# Altium footprint library Connector_Samtec_HLE_SMD.PcbLib: 290 footprints (part 15 of 24)
Each footprint in its own frame and in the unit in brackets; x right, y up, seen from the top. Pads: shape width x height; smd on the part's side, far side on the other; paste and mask are expansions set on the pad; w line width, h text height; cw(c..) or ccw(c..) is an arc to the next point about the centre after c.
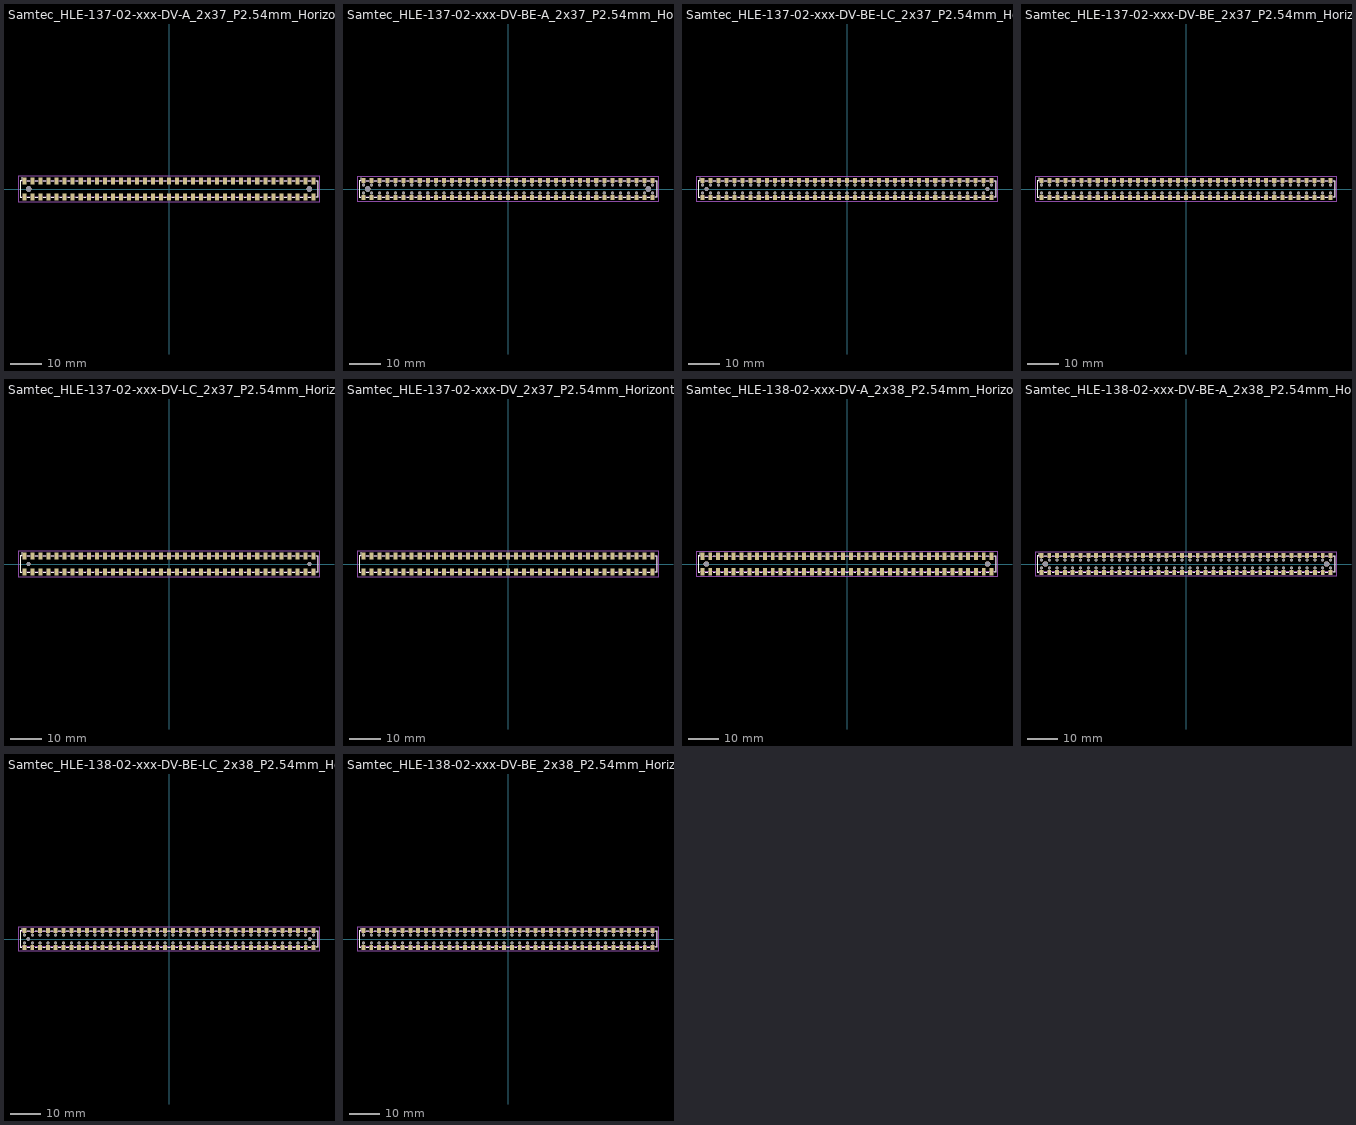
[diagram p14: the footprints below, top view; thin cyan lines are the x and y axes]

## Samtec_HLE-137-02-xxx-DV-A_2x37_P2.54mm_Horizontal [mm]
pads (76):
  rect 1.27x2.29 smd: 1(-45.72,2.525) 2(-45.72,-2.525) 3(-43.18,2.525) 4(-43.18,-2.525) 5(-40.64,2.525) 6(-40.64,-2.525) 7(-38.1,2.525) 8(-38.1,-2.525) 9(-35.56,2.525) 10(-35.56,-2.525) 11(-33.02,2.525) 12(-33.02,-2.525) 13(-30.48,2.525) 14(-30.48,-2.525) 15(-27.94,2.525) 16(-27.94,-2.525) 17(-25.4,2.525) 18(-25.4,-2.525) 19(-22.86,2.525) 20(-22.86,-2.525) 21(-20.32,2.525) 22(-20.32,-2.525) 23(-17.78,2.525) 24(-17.78,-2.525) 25(-15.24,2.525) 26(-15.24,-2.525) 27(-12.7,2.525) 28(-12.7,-2.525) 29(-10.16,2.525) 30(-10.16,-2.525) 31(-7.62,2.525) 32(-7.62,-2.525) 33(-5.08,2.525) 34(-5.08,-2.525) 35(-2.54,2.525) 36(-2.54,-2.525) 37(0,2.525) 38(0,-2.525) 39(2.54,2.525) 40(2.54,-2.525) 41(5.08,2.525) 42(5.08,-2.525) 43(7.62,2.525) 44(7.62,-2.525) 45(10.16,2.525) 46(10.16,-2.525) 47(12.7,2.525) 48(12.7,-2.525) 49(15.24,2.525) 50(15.24,-2.525) 51(17.78,2.525) 52(17.78,-2.525) 53(20.32,2.525) 54(20.32,-2.525) 55(22.86,2.525) 56(22.86,-2.525) 57(25.4,2.525) 58(25.4,-2.525) 59(27.94,2.525) 60(27.94,-2.525) 61(30.48,2.525) 62(30.48,-2.525) 63(33.02,2.525) 64(33.02,-2.525) 65(35.56,2.525) 66(35.56,-2.525) 67(38.1,2.525) 68(38.1,-2.525) 69(40.64,2.525) 70(40.64,-2.525) 71(43.18,2.525) 72(43.18,-2.525) 73(45.72,2.525) 74(45.72,-2.525)
  round 1.78 hole 1.78: Un1(-44.45,0) Un2(44.45,0)
F.SilkS:
  lines w0.12: -46.615,-2.65 -47.1,-2.65 -47.1,2.65 -46.615,2.65 -46.615,3.67 ; -44.825,-2.65 -44.075,-2.65 ; -44.825,2.65 -44.075,2.65 ; -42.285,-2.65 -41.535,-2.65 ; -42.285,2.65 -41.535,2.65 ; -39.745,-2.65 -38.995,-2.65 ; -39.745,2.65 -38.995,2.65 ; -37.205,-2.65 -36.455,-2.65 ; -37.205,2.65 -36.455,2.65 ; -34.665,-2.65 -33.915,-2.65 ; -34.665,2.65 -33.915,2.65 ; -32.125,-2.65 -31.375,-2.65 ; -32.125,2.65 -31.375,2.65 ; -29.585,-2.65 -28.835,-2.65 ; -29.585,2.65 -28.835,2.65 ; -27.045,-2.65 -26.295,-2.65 ; -27.045,2.65 -26.295,2.65 ; -24.505,-2.65 -23.755,-2.65 ; -24.505,2.65 -23.755,2.65 ; -21.965,-2.65 -21.215,-2.65 ; -21.965,2.65 -21.215,2.65 ; -19.425,-2.65 -18.675,-2.65 ; -19.425,2.65 -18.675,2.65 ; -16.885,-2.65 -16.135,-2.65 ; -16.885,2.65 -16.135,2.65 ; -14.345,-2.65 -13.595,-2.65 ; -14.345,2.65 -13.595,2.65 ; -11.805,-2.65 -11.055,-2.65 ; -11.805,2.65 -11.055,2.65 ; -9.265,-2.65 -8.515,-2.65 ; -9.265,2.65 -8.515,2.65 ; -6.725,-2.65 -5.975,-2.65 ; -6.725,2.65 -5.975,2.65 ; -4.185,-2.65 -3.435,-2.65 ; -4.185,2.65 -3.435,2.65 ; -1.645,-2.65 -0.895,-2.65 ; -1.645,2.65 -0.895,2.65 ; 0.895,-2.65 1.645,-2.65 ; 0.895,2.65 1.645,2.65 ; 3.435,-2.65 4.185,-2.65 ; 3.435,2.65 4.185,2.65 ; 5.975,-2.65 6.725,-2.65 ; 5.975,2.65 6.725,2.65 ; 8.515,-2.65 9.265,-2.65 ; 8.515,2.65 9.265,2.65 ; 11.055,-2.65 11.805,-2.65 ; 11.055,2.65 11.805,2.65 ; 13.595,-2.65 14.345,-2.65 ; 13.595,2.65 14.345,2.65 ; 16.135,-2.65 16.885,-2.65 ; 16.135,2.65 16.885,2.65 ; 18.675,-2.65 19.425,-2.65 ; 18.675,2.65 19.425,2.65 ; 21.215,-2.65 21.965,-2.65 ; 21.215,2.65 21.965,2.65 ; 23.755,-2.65 24.505,-2.65 ; 23.755,2.65 24.505,2.65 ; 26.295,-2.65 27.045,-2.65 ; 26.295,2.65 27.045,2.65 ; 28.835,-2.65 29.585,-2.65 ; 28.835,2.65 29.585,2.65 ; 31.375,-2.65 32.125,-2.65 ; 31.375,2.65 32.125,2.65 ; 33.915,-2.65 34.665,-2.65 ; 33.915,2.65 34.665,2.65 ; 36.455,-2.65 37.205,-2.65 ; 36.455,2.65 37.205,2.65 ; 38.995,-2.65 39.745,-2.65 ; 38.995,2.65 39.745,2.65 ; 41.535,-2.65 42.285,-2.65 ; 41.535,2.65 42.285,2.65 ; 44.075,-2.65 44.825,-2.65 ; 44.075,2.65 44.825,2.65 ; 46.615,-2.65 47.1,-2.65 47.1,2.65 46.615,2.65
F.CrtYd:
  lines w0.05: -47.49,-4.17 -47.49,4.17 47.49,4.17 47.49,-4.17 -47.49,-4.17
F.Fab:
  lines w0.1: -46.22,2.54 -45.72,1.833 -45.22,2.54 ; -46.99,-2.54 -46.99,2.54 46.99,2.54 46.99,-2.54 -46.99,-2.54
  text "'.Designator'" at -4.047,-2.68 h1

## Samtec_HLE-137-02-xxx-DV-BE-A_2x37_P2.54mm_Horizontal [mm]
pads (150):
  rect 1.27x1.68 smd: 1(-45.72,2.72) 2(-45.72,-2.72) 3(-43.18,2.72) 4(-43.18,-2.72) 5(-40.64,2.72) 6(-40.64,-2.72) 7(-38.1,2.72) 8(-38.1,-2.72) 9(-35.56,2.72) 10(-35.56,-2.72) 11(-33.02,2.72) 12(-33.02,-2.72) 13(-30.48,2.72) 14(-30.48,-2.72) 15(-27.94,2.72) 16(-27.94,-2.72) 17(-25.4,2.72) 18(-25.4,-2.72) 19(-22.86,2.72) 20(-22.86,-2.72) 21(-20.32,2.72) 22(-20.32,-2.72) 23(-17.78,2.72) 24(-17.78,-2.72) 25(-15.24,2.72) 26(-15.24,-2.72) 27(-12.7,2.72) 28(-12.7,-2.72) 29(-10.16,2.72) 30(-10.16,-2.72) 31(-7.62,2.72) 32(-7.62,-2.72) 33(-5.08,2.72) 34(-5.08,-2.72) 35(-2.54,2.72) 36(-2.54,-2.72) 37(0,2.72) 38(0,-2.72) 39(2.54,2.72) 40(2.54,-2.72) 41(5.08,2.72) 42(5.08,-2.72) 43(7.62,2.72) 44(7.62,-2.72) 45(10.16,2.72) 46(10.16,-2.72) 47(12.7,2.72) 48(12.7,-2.72) 49(15.24,2.72) 50(15.24,-2.72) 51(17.78,2.72) 52(17.78,-2.72) 53(20.32,2.72) 54(20.32,-2.72) 55(22.86,2.72) 56(22.86,-2.72) 57(25.4,2.72) 58(25.4,-2.72) 59(27.94,2.72) 60(27.94,-2.72) 61(30.48,2.72) 62(30.48,-2.72) 63(33.02,2.72) 64(33.02,-2.72) 65(35.56,2.72) 66(35.56,-2.72) 67(38.1,2.72) 68(38.1,-2.72) 69(40.64,2.72) 70(40.64,-2.72) 71(43.18,2.72) 72(43.18,-2.72) 73(45.72,2.72) 74(45.72,-2.72)
  round 0.97 hole 0.97: Un1(-43.18,1.27) Un2(27.94,-1.27) Un3(35.56,-1.27) Un4(-38.1,-1.27) Un5(-10.16,1.27) Un6(15.24,1.27) Un7(17.78,1.27) Un8(38.1,-1.27) Un9(33.02,1.27) Un10(20.32,1.27) Un11(-35.56,1.27) Un12(30.48,-1.27) Un13(2.54,-1.27) Un14(-7.62,1.27) Un15(-40.64,1.27) Un16(2.54,1.27) Un17(0,1.27) Un18(10.16,1.27) Un19(-33.02,1.27) Un20(-43.18,-1.27) Un21(-25.4,1.27) Un22(-38.1,1.27) Un23(-35.56,-1.27) Un24(45.72,1.27) Un25(40.64,1.27) Un27(43.18,1.27) Un28(45.72,-1.27) Un29(-10.16,-1.27) Un30(-22.86,1.27) Un31(-2.54,-1.27) Un32(-5.08,-1.27) Un33(-27.94,1.27) Un34(-27.94,-1.27) Un35(30.48,1.27) Un36(25.4,-1.27) Un37(-12.7,-1.27) Un38(12.7,-1.27) Un39(-30.48,-1.27) Un40(-25.4,-1.27) Un41(-5.08,1.27) Un42(10.16,-1.27) Un43(22.86,-1.27) Un44(25.4,1.27) Un45(-30.48,1.27) Un46(15.24,-1.27) Un47(-17.78,1.27) Un48(5.08,1.27) Un49(38.1,1.27) Un50(-40.64,-1.27) Un51(27.94,1.27) Un52(-20.32,-1.27) Un53(-17.78,-1.27) Un54(-45.72,1.27) Un55(20.32,-1.27) Un56(40.64,-1.27) Un58(-15.24,1.27) Un59(7.62,1.27) Un60(-22.86,-1.27) Un61(17.78,-1.27) Un62(-20.32,1.27) Un63(0,-1.27) Un64(-33.02,-1.27) Un65(22.86,1.27) Un66(-2.54,1.27) Un67(33.02,-1.27) Un68(-45.72,-1.27) Un69(7.62,-1.27) Un70(-15.24,-1.27) Un71(12.7,1.27) Un72(-12.7,1.27) Un73(43.18,-1.27) Un74(35.56,1.27) Un75(-7.62,-1.27) Un76(5.08,-1.27)
  round 1.78 hole 1.78: Un26(-44.45,0) Un57(44.45,0)
F.SilkS:
  lines w0.12: -46.615,-2.65 -47.1,-2.65 -47.1,2.65 -46.615,2.65 -46.615,3.56 ; -44.825,-2.65 -44.075,-2.65 ; -44.825,2.65 -44.075,2.65 ; -42.285,-2.65 -41.535,-2.65 ; -42.285,2.65 -41.535,2.65 ; -39.745,-2.65 -38.995,-2.65 ; -39.745,2.65 -38.995,2.65 ; -37.205,-2.65 -36.455,-2.65 ; -37.205,2.65 -36.455,2.65 ; -34.665,-2.65 -33.915,-2.65 ; -34.665,2.65 -33.915,2.65 ; -32.125,-2.65 -31.375,-2.65 ; -32.125,2.65 -31.375,2.65 ; -29.585,-2.65 -28.835,-2.65 ; -29.585,2.65 -28.835,2.65 ; -27.045,-2.65 -26.295,-2.65 ; -27.045,2.65 -26.295,2.65 ; -24.505,-2.65 -23.755,-2.65 ; -24.505,2.65 -23.755,2.65 ; -21.965,-2.65 -21.215,-2.65 ; -21.965,2.65 -21.215,2.65 ; -19.425,-2.65 -18.675,-2.65 ; -19.425,2.65 -18.675,2.65 ; -16.885,-2.65 -16.135,-2.65 ; -16.885,2.65 -16.135,2.65 ; -14.345,-2.65 -13.595,-2.65 ; -14.345,2.65 -13.595,2.65 ; -11.805,-2.65 -11.055,-2.65 ; -11.805,2.65 -11.055,2.65 ; -9.265,-2.65 -8.515,-2.65 ; -9.265,2.65 -8.515,2.65 ; -6.725,-2.65 -5.975,-2.65 ; -6.725,2.65 -5.975,2.65 ; -4.185,-2.65 -3.435,-2.65 ; -4.185,2.65 -3.435,2.65 ; -1.645,-2.65 -0.895,-2.65 ; -1.645,2.65 -0.895,2.65 ; 0.895,-2.65 1.645,-2.65 ; 0.895,2.65 1.645,2.65 ; 3.435,-2.65 4.185,-2.65 ; 3.435,2.65 4.185,2.65 ; 5.975,-2.65 6.725,-2.65 ; 5.975,2.65 6.725,2.65 ; 8.515,-2.65 9.265,-2.65 ; 8.515,2.65 9.265,2.65 ; 11.055,-2.65 11.805,-2.65 ; 11.055,2.65 11.805,2.65 ; 13.595,-2.65 14.345,-2.65 ; 13.595,2.65 14.345,2.65 ; 16.135,-2.65 16.885,-2.65 ; 16.135,2.65 16.885,2.65 ; 18.675,-2.65 19.425,-2.65 ; 18.675,2.65 19.425,2.65 ; 21.215,-2.65 21.965,-2.65 ; 21.215,2.65 21.965,2.65 ; 23.755,-2.65 24.505,-2.65 ; 23.755,2.65 24.505,2.65 ; 26.295,-2.65 27.045,-2.65 ; 26.295,2.65 27.045,2.65 ; 28.835,-2.65 29.585,-2.65 ; 28.835,2.65 29.585,2.65 ; 31.375,-2.65 32.125,-2.65 ; 31.375,2.65 32.125,2.65 ; 33.915,-2.65 34.665,-2.65 ; 33.915,2.65 34.665,2.65 ; 36.455,-2.65 37.205,-2.65 ; 36.455,2.65 37.205,2.65 ; 38.995,-2.65 39.745,-2.65 ; 38.995,2.65 39.745,2.65 ; 41.535,-2.65 42.285,-2.65 ; 41.535,2.65 42.285,2.65 ; 44.075,-2.65 44.825,-2.65 ; 44.075,2.65 44.825,2.65 ; 46.615,-2.65 47.1,-2.65 47.1,2.65 46.615,2.65
F.CrtYd:
  lines w0.05: -47.49,-4.06 47.49,-4.06 47.49,4.06 -47.49,4.06 -47.49,-4.06
F.Fab:
  lines w0.1: -46.22,2.54 -45.72,1.833 -45.22,2.54 ; -46.99,-2.54 46.99,-2.54 46.99,2.54 -46.99,2.54 -46.99,-2.54
  text "'.Designator'" at -4.047,-2.68 h1

## Samtec_HLE-137-02-xxx-DV-BE-LC_2x37_P2.54mm_Horizontal [mm]
pads (150):
  rect 1.27x1.68 smd: 1(-45.72,2.72) 2(-45.72,-2.72) 3(-43.18,2.72) 4(-43.18,-2.72) 5(-40.64,2.72) 6(-40.64,-2.72) 7(-38.1,2.72) 8(-38.1,-2.72) 9(-35.56,2.72) 10(-35.56,-2.72) 11(-33.02,2.72) 12(-33.02,-2.72) 13(-30.48,2.72) 14(-30.48,-2.72) 15(-27.94,2.72) 16(-27.94,-2.72) 17(-25.4,2.72) 18(-25.4,-2.72) 19(-22.86,2.72) 20(-22.86,-2.72) 21(-20.32,2.72) 22(-20.32,-2.72) 23(-17.78,2.72) 24(-17.78,-2.72) 25(-15.24,2.72) 26(-15.24,-2.72) 27(-12.7,2.72) 28(-12.7,-2.72) 29(-10.16,2.72) 30(-10.16,-2.72) 31(-7.62,2.72) 32(-7.62,-2.72) 33(-5.08,2.72) 34(-5.08,-2.72) 35(-2.54,2.72) 36(-2.54,-2.72) 37(0,2.72) 38(0,-2.72) 39(2.54,2.72) 40(2.54,-2.72) 41(5.08,2.72) 42(5.08,-2.72) 43(7.62,2.72) 44(7.62,-2.72) 45(10.16,2.72) 46(10.16,-2.72) 47(12.7,2.72) 48(12.7,-2.72) 49(15.24,2.72) 50(15.24,-2.72) 51(17.78,2.72) 52(17.78,-2.72) 53(20.32,2.72) 54(20.32,-2.72) 55(22.86,2.72) 56(22.86,-2.72) 57(25.4,2.72) 58(25.4,-2.72) 59(27.94,2.72) 60(27.94,-2.72) 61(30.48,2.72) 62(30.48,-2.72) 63(33.02,2.72) 64(33.02,-2.72) 65(35.56,2.72) 66(35.56,-2.72) 67(38.1,2.72) 68(38.1,-2.72) 69(40.64,2.72) 70(40.64,-2.72) 71(43.18,2.72) 72(43.18,-2.72) 73(45.72,2.72) 74(45.72,-2.72)
  round 0.97 hole 0.97: Un1(-22.86,1.27) Un2(30.48,1.27) Un3(38.1,-1.27) Un4(5.08,-1.27) Un5(-45.72,1.27) Un6(35.56,1.27) Un7(22.86,-1.27) Un8(-43.18,1.27) Un9(-5.08,-1.27) Un10(-25.4,1.27) Un11(7.62,-1.27) Un12(-35.56,-1.27) Un13(15.24,1.27) Un15(40.64,1.27) Un16(-25.4,-1.27) Un17(12.7,-1.27) Un18(33.02,1.27) Un19(-5.08,1.27) Un20(-2.54,-1.27) Un21(-10.16,1.27) Un22(2.54,1.27) Un23(33.02,-1.27) Un24(17.78,-1.27) Un25(35.56,-1.27) Un26(-15.24,1.27) Un27(27.94,1.27) Un28(-45.72,-1.27) Un29(20.32,-1.27) Un30(-10.16,-1.27) Un31(43.18,-1.27) Un32(-38.1,-1.27) Un33(30.48,-1.27) Un34(38.1,1.27) Un35(27.94,-1.27) Un36(25.4,1.27) Un37(-20.32,1.27) Un38(2.54,-1.27) Un39(40.64,-1.27) Un40(-43.18,-1.27) Un41(-27.94,1.27) Un42(-33.02,-1.27) Un43(-2.54,1.27) Un44(-15.24,-1.27) Un45(10.16,-1.27) Un46(10.16,1.27) Un47(17.78,1.27) Un48(-33.02,1.27) Un49(-22.86,-1.27) Un50(-30.48,-1.27) Un51(25.4,-1.27) Un52(-17.78,1.27) Un53(7.62,1.27) Un54(45.72,-1.27) Un55(-27.94,-1.27) Un56(45.72,1.27) Un57(20.32,1.27) Un58(15.24,-1.27) Un59(12.7,1.27) Un60(-30.48,1.27) Un62(-12.7,1.27) Un63(-12.7,-1.27) Un64(22.86,1.27) Un65(-7.62,1.27) Un66(5.08,1.27) Un67(-35.56,1.27) Un68(43.18,1.27) Un69(-40.64,-1.27) Un70(-40.64,1.27) Un71(-7.62,-1.27) Un72(0,-1.27) Un73(0,1.27) Un74(-20.32,-1.27) Un75(-17.78,-1.27) Un76(-38.1,1.27)
  round 1.19 hole 1.19: Un14(-44.45,0) Un61(44.45,0)
F.SilkS:
  lines w0.12: -46.615,-2.65 -47.1,-2.65 -47.1,2.65 -46.615,2.65 -46.615,3.56 ; -44.825,-2.65 -44.075,-2.65 ; -44.825,2.65 -44.075,2.65 ; -42.285,-2.65 -41.535,-2.65 ; -42.285,2.65 -41.535,2.65 ; -39.745,-2.65 -38.995,-2.65 ; -39.745,2.65 -38.995,2.65 ; -37.205,-2.65 -36.455,-2.65 ; -37.205,2.65 -36.455,2.65 ; -34.665,-2.65 -33.915,-2.65 ; -34.665,2.65 -33.915,2.65 ; -32.125,-2.65 -31.375,-2.65 ; -32.125,2.65 -31.375,2.65 ; -29.585,-2.65 -28.835,-2.65 ; -29.585,2.65 -28.835,2.65 ; -27.045,-2.65 -26.295,-2.65 ; -27.045,2.65 -26.295,2.65 ; -24.505,-2.65 -23.755,-2.65 ; -24.505,2.65 -23.755,2.65 ; -21.965,-2.65 -21.215,-2.65 ; -21.965,2.65 -21.215,2.65 ; -19.425,-2.65 -18.675,-2.65 ; -19.425,2.65 -18.675,2.65 ; -16.885,-2.65 -16.135,-2.65 ; -16.885,2.65 -16.135,2.65 ; -14.345,-2.65 -13.595,-2.65 ; -14.345,2.65 -13.595,2.65 ; -11.805,-2.65 -11.055,-2.65 ; -11.805,2.65 -11.055,2.65 ; -9.265,-2.65 -8.515,-2.65 ; -9.265,2.65 -8.515,2.65 ; -6.725,-2.65 -5.975,-2.65 ; -6.725,2.65 -5.975,2.65 ; -4.185,-2.65 -3.435,-2.65 ; -4.185,2.65 -3.435,2.65 ; -1.645,-2.65 -0.895,-2.65 ; -1.645,2.65 -0.895,2.65 ; 0.895,-2.65 1.645,-2.65 ; 0.895,2.65 1.645,2.65 ; 3.435,-2.65 4.185,-2.65 ; 3.435,2.65 4.185,2.65 ; 5.975,-2.65 6.725,-2.65 ; 5.975,2.65 6.725,2.65 ; 8.515,-2.65 9.265,-2.65 ; 8.515,2.65 9.265,2.65 ; 11.055,-2.65 11.805,-2.65 ; 11.055,2.65 11.805,2.65 ; 13.595,-2.65 14.345,-2.65 ; 13.595,2.65 14.345,2.65 ; 16.135,-2.65 16.885,-2.65 ; 16.135,2.65 16.885,2.65 ; 18.675,-2.65 19.425,-2.65 ; 18.675,2.65 19.425,2.65 ; 21.215,-2.65 21.965,-2.65 ; 21.215,2.65 21.965,2.65 ; 23.755,-2.65 24.505,-2.65 ; 23.755,2.65 24.505,2.65 ; 26.295,-2.65 27.045,-2.65 ; 26.295,2.65 27.045,2.65 ; 28.835,-2.65 29.585,-2.65 ; 28.835,2.65 29.585,2.65 ; 31.375,-2.65 32.125,-2.65 ; 31.375,2.65 32.125,2.65 ; 33.915,-2.65 34.665,-2.65 ; 33.915,2.65 34.665,2.65 ; 36.455,-2.65 37.205,-2.65 ; 36.455,2.65 37.205,2.65 ; 38.995,-2.65 39.745,-2.65 ; 38.995,2.65 39.745,2.65 ; 41.535,-2.65 42.285,-2.65 ; 41.535,2.65 42.285,2.65 ; 44.075,-2.65 44.825,-2.65 ; 44.075,2.65 44.825,2.65 ; 46.615,-2.65 47.1,-2.65 47.1,2.65 46.615,2.65
F.CrtYd:
  lines w0.05: -47.49,-4.06 47.49,-4.06 47.49,4.06 -47.49,4.06 -47.49,-4.06
F.Fab:
  lines w0.1: -46.22,2.54 -45.72,1.833 -45.22,2.54 ; -46.99,-2.54 46.99,-2.54 46.99,2.54 -46.99,2.54 -46.99,-2.54
  text "'.Designator'" at -4.047,-2.68 h1

## Samtec_HLE-137-02-xxx-DV-BE_2x37_P2.54mm_Horizontal [mm]
pads (148):
  rect 1.27x1.68 smd: 1(-45.72,2.72) 2(-45.72,-2.72) 3(-43.18,2.72) 4(-43.18,-2.72) 5(-40.64,2.72) 6(-40.64,-2.72) 7(-38.1,2.72) 8(-38.1,-2.72) 9(-35.56,2.72) 10(-35.56,-2.72) 11(-33.02,2.72) 12(-33.02,-2.72) 13(-30.48,2.72) 14(-30.48,-2.72) 15(-27.94,2.72) 16(-27.94,-2.72) 17(-25.4,2.72) 18(-25.4,-2.72) 19(-22.86,2.72) 20(-22.86,-2.72) 21(-20.32,2.72) 22(-20.32,-2.72) 23(-17.78,2.72) 24(-17.78,-2.72) 25(-15.24,2.72) 26(-15.24,-2.72) 27(-12.7,2.72) 28(-12.7,-2.72) 29(-10.16,2.72) 30(-10.16,-2.72) 31(-7.62,2.72) 32(-7.62,-2.72) 33(-5.08,2.72) 34(-5.08,-2.72) 35(-2.54,2.72) 36(-2.54,-2.72) 37(0,2.72) 38(0,-2.72) 39(2.54,2.72) 40(2.54,-2.72) 41(5.08,2.72) 42(5.08,-2.72) 43(7.62,2.72) 44(7.62,-2.72) 45(10.16,2.72) 46(10.16,-2.72) 47(12.7,2.72) 48(12.7,-2.72) 49(15.24,2.72) 50(15.24,-2.72) 51(17.78,2.72) 52(17.78,-2.72) 53(20.32,2.72) 54(20.32,-2.72) 55(22.86,2.72) 56(22.86,-2.72) 57(25.4,2.72) 58(25.4,-2.72) 59(27.94,2.72) 60(27.94,-2.72) 61(30.48,2.72) 62(30.48,-2.72) 63(33.02,2.72) 64(33.02,-2.72) 65(35.56,2.72) 66(35.56,-2.72) 67(38.1,2.72) 68(38.1,-2.72) 69(40.64,2.72) 70(40.64,-2.72) 71(43.18,2.72) 72(43.18,-2.72) 73(45.72,2.72) 74(45.72,-2.72)
  round 0.97 hole 0.97: Un1(25.4,-1.27) Un2(-40.64,1.27) Un3(15.24,-1.27) Un4(-10.16,1.27) Un5(-22.86,1.27) Un6(22.86,1.27) Un7(-12.7,1.27) Un8(-33.02,-1.27) Un9(-7.62,1.27) Un10(-38.1,-1.27) Un11(20.32,1.27) Un12(-33.02,1.27) Un13(-15.24,1.27) Un14(7.62,-1.27) Un15(30.48,-1.27) Un16(-12.7,-1.27) Un17(2.54,1.27) Un18(43.18,1.27) Un19(-40.64,-1.27) Un20(0,-1.27) Un21(5.08,-1.27) Un22(-25.4,1.27) Un23(20.32,-1.27) Un24(7.62,1.27) Un25(15.24,1.27) Un26(25.4,1.27) Un27(40.64,1.27) Un28(-2.54,1.27) Un29(-43.18,-1.27) Un30(27.94,1.27) Un31(-10.16,-1.27) Un32(-17.78,-1.27) Un33(-15.24,-1.27) Un34(-25.4,-1.27) Un35(-20.32,-1.27) Un36(-30.48,1.27) Un37(-43.18,1.27) Un38(43.18,-1.27) Un39(-20.32,1.27) Un40(-22.86,-1.27) Un41(-7.62,-1.27) Un42(-27.94,-1.27) Un43(-45.72,-1.27) Un44(-45.72,1.27) Un45(40.64,-1.27) Un46(30.48,1.27) Un47(12.7,-1.27) Un48(-2.54,-1.27) Un49(17.78,1.27) Un50(10.16,1.27) Un51(-27.94,1.27) Un52(-30.48,-1.27) Un53(35.56,-1.27) Un54(-17.78,1.27) Un55(5.08,1.27) Un56(22.86,-1.27) Un57(33.02,-1.27) Un58(35.56,1.27) Un59(12.7,1.27) Un60(-5.08,-1.27) Un61(2.54,-1.27) Un62(-35.56,-1.27) Un63(-38.1,1.27) Un64(10.16,-1.27) Un65(27.94,-1.27) Un66(38.1,-1.27) Un67(0,1.27) Un68(-35.56,1.27) Un69(45.72,-1.27) Un70(38.1,1.27) Un71(17.78,-1.27) Un72(45.72,1.27) Un73(-5.08,1.27) Un74(33.02,1.27)
F.SilkS:
  lines w0.12: -46.615,-2.65 -47.1,-2.65 -47.1,2.65 -46.615,2.65 -46.615,3.56 ; -44.825,-2.65 -44.075,-2.65 ; -44.825,2.65 -44.075,2.65 ; -42.285,-2.65 -41.535,-2.65 ; -42.285,2.65 -41.535,2.65 ; -39.745,-2.65 -38.995,-2.65 ; -39.745,2.65 -38.995,2.65 ; -37.205,-2.65 -36.455,-2.65 ; -37.205,2.65 -36.455,2.65 ; -34.665,-2.65 -33.915,-2.65 ; -34.665,2.65 -33.915,2.65 ; -32.125,-2.65 -31.375,-2.65 ; -32.125,2.65 -31.375,2.65 ; -29.585,-2.65 -28.835,-2.65 ; -29.585,2.65 -28.835,2.65 ; -27.045,-2.65 -26.295,-2.65 ; -27.045,2.65 -26.295,2.65 ; -24.505,-2.65 -23.755,-2.65 ; -24.505,2.65 -23.755,2.65 ; -21.965,-2.65 -21.215,-2.65 ; -21.965,2.65 -21.215,2.65 ; -19.425,-2.65 -18.675,-2.65 ; -19.425,2.65 -18.675,2.65 ; -16.885,-2.65 -16.135,-2.65 ; -16.885,2.65 -16.135,2.65 ; -14.345,-2.65 -13.595,-2.65 ; -14.345,2.65 -13.595,2.65 ; -11.805,-2.65 -11.055,-2.65 ; -11.805,2.65 -11.055,2.65 ; -9.265,-2.65 -8.515,-2.65 ; -9.265,2.65 -8.515,2.65 ; -6.725,-2.65 -5.975,-2.65 ; -6.725,2.65 -5.975,2.65 ; -4.185,-2.65 -3.435,-2.65 ; -4.185,2.65 -3.435,2.65 ; -1.645,-2.65 -0.895,-2.65 ; -1.645,2.65 -0.895,2.65 ; 0.895,-2.65 1.645,-2.65 ; 0.895,2.65 1.645,2.65 ; 3.435,-2.65 4.185,-2.65 ; 3.435,2.65 4.185,2.65 ; 5.975,-2.65 6.725,-2.65 ; 5.975,2.65 6.725,2.65 ; 8.515,-2.65 9.265,-2.65 ; 8.515,2.65 9.265,2.65 ; 11.055,-2.65 11.805,-2.65 ; 11.055,2.65 11.805,2.65 ; 13.595,-2.65 14.345,-2.65 ; 13.595,2.65 14.345,2.65 ; 16.135,-2.65 16.885,-2.65 ; 16.135,2.65 16.885,2.65 ; 18.675,-2.65 19.425,-2.65 ; 18.675,2.65 19.425,2.65 ; 21.215,-2.65 21.965,-2.65 ; 21.215,2.65 21.965,2.65 ; 23.755,-2.65 24.505,-2.65 ; 23.755,2.65 24.505,2.65 ; 26.295,-2.65 27.045,-2.65 ; 26.295,2.65 27.045,2.65 ; 28.835,-2.65 29.585,-2.65 ; 28.835,2.65 29.585,2.65 ; 31.375,-2.65 32.125,-2.65 ; 31.375,2.65 32.125,2.65 ; 33.915,-2.65 34.665,-2.65 ; 33.915,2.65 34.665,2.65 ; 36.455,-2.65 37.205,-2.65 ; 36.455,2.65 37.205,2.65 ; 38.995,-2.65 39.745,-2.65 ; 38.995,2.65 39.745,2.65 ; 41.535,-2.65 42.285,-2.65 ; 41.535,2.65 42.285,2.65 ; 44.075,-2.65 44.825,-2.65 ; 44.075,2.65 44.825,2.65 ; 46.615,-2.65 47.1,-2.65 47.1,2.65 46.615,2.65
F.CrtYd:
  lines w0.05: -47.49,-4.06 47.49,-4.06 47.49,4.06 -47.49,4.06 -47.49,-4.06
F.Fab:
  lines w0.1: -46.22,2.54 -45.72,1.833 -45.22,2.54 ; -46.99,-2.54 -46.99,2.54 46.99,2.54 46.99,-2.54 -46.99,-2.54
  text "'.Designator'" at -4.047,-2.68 h1

## Samtec_HLE-137-02-xxx-DV-LC_2x37_P2.54mm_Horizontal [mm]
pads (76):
  rect 1.27x2.29 smd: 1(-45.72,2.525) 2(-45.72,-2.525) 3(-43.18,2.525) 4(-43.18,-2.525) 5(-40.64,2.525) 6(-40.64,-2.525) 7(-38.1,2.525) 8(-38.1,-2.525) 9(-35.56,2.525) 10(-35.56,-2.525) 11(-33.02,2.525) 12(-33.02,-2.525) 13(-30.48,2.525) 14(-30.48,-2.525) 15(-27.94,2.525) 16(-27.94,-2.525) 17(-25.4,2.525) 18(-25.4,-2.525) 19(-22.86,2.525) 20(-22.86,-2.525) 21(-20.32,2.525) 22(-20.32,-2.525) 23(-17.78,2.525) 24(-17.78,-2.525) 25(-15.24,2.525) 26(-15.24,-2.525) 27(-12.7,2.525) 28(-12.7,-2.525) 29(-10.16,2.525) 30(-10.16,-2.525) 31(-7.62,2.525) 32(-7.62,-2.525) 33(-5.08,2.525) 34(-5.08,-2.525) 35(-2.54,2.525) 36(-2.54,-2.525) 37(0,2.525) 38(0,-2.525) 39(2.54,2.525) 40(2.54,-2.525) 41(5.08,2.525) 42(5.08,-2.525) 43(7.62,2.525) 44(7.62,-2.525) 45(10.16,2.525) 46(10.16,-2.525) 47(12.7,2.525) 48(12.7,-2.525) 49(15.24,2.525) 50(15.24,-2.525) 51(17.78,2.525) 52(17.78,-2.525) 53(20.32,2.525) 54(20.32,-2.525) 55(22.86,2.525) 56(22.86,-2.525) 57(25.4,2.525) 58(25.4,-2.525) 59(27.94,2.525) 60(27.94,-2.525) 61(30.48,2.525) 62(30.48,-2.525) 63(33.02,2.525) 64(33.02,-2.525) 65(35.56,2.525) 66(35.56,-2.525) 67(38.1,2.525) 68(38.1,-2.525) 69(40.64,2.525) 70(40.64,-2.525) 71(43.18,2.525) 72(43.18,-2.525) 73(45.72,2.525) 74(45.72,-2.525)
  round 1.19 hole 1.19: Un1(44.45,0) Un2(-44.45,0)
F.SilkS:
  lines w0.12: -46.615,-2.65 -47.1,-2.65 -47.1,2.65 -46.615,2.65 -46.615,3.67 ; -44.825,-2.65 -44.075,-2.65 ; -44.825,2.65 -44.075,2.65 ; -42.285,-2.65 -41.535,-2.65 ; -42.285,2.65 -41.535,2.65 ; -39.745,-2.65 -38.995,-2.65 ; -39.745,2.65 -38.995,2.65 ; -37.205,-2.65 -36.455,-2.65 ; -37.205,2.65 -36.455,2.65 ; -34.665,-2.65 -33.915,-2.65 ; -34.665,2.65 -33.915,2.65 ; -32.125,-2.65 -31.375,-2.65 ; -32.125,2.65 -31.375,2.65 ; -29.585,-2.65 -28.835,-2.65 ; -29.585,2.65 -28.835,2.65 ; -27.045,-2.65 -26.295,-2.65 ; -27.045,2.65 -26.295,2.65 ; -24.505,-2.65 -23.755,-2.65 ; -24.505,2.65 -23.755,2.65 ; -21.965,-2.65 -21.215,-2.65 ; -21.965,2.65 -21.215,2.65 ; -19.425,-2.65 -18.675,-2.65 ; -19.425,2.65 -18.675,2.65 ; -16.885,-2.65 -16.135,-2.65 ; -16.885,2.65 -16.135,2.65 ; -14.345,-2.65 -13.595,-2.65 ; -14.345,2.65 -13.595,2.65 ; -11.805,-2.65 -11.055,-2.65 ; -11.805,2.65 -11.055,2.65 ; -9.265,-2.65 -8.515,-2.65 ; -9.265,2.65 -8.515,2.65 ; -6.725,-2.65 -5.975,-2.65 ; -6.725,2.65 -5.975,2.65 ; -4.185,-2.65 -3.435,-2.65 ; -4.185,2.65 -3.435,2.65 ; -1.645,-2.65 -0.895,-2.65 ; -1.645,2.65 -0.895,2.65 ; 0.895,-2.65 1.645,-2.65 ; 0.895,2.65 1.645,2.65 ; 3.435,-2.65 4.185,-2.65 ; 3.435,2.65 4.185,2.65 ; 5.975,-2.65 6.725,-2.65 ; 5.975,2.65 6.725,2.65 ; 8.515,-2.65 9.265,-2.65 ; 8.515,2.65 9.265,2.65 ; 11.055,-2.65 11.805,-2.65 ; 11.055,2.65 11.805,2.65 ; 13.595,-2.65 14.345,-2.65 ; 13.595,2.65 14.345,2.65 ; 16.135,-2.65 16.885,-2.65 ; 16.135,2.65 16.885,2.65 ; 18.675,-2.65 19.425,-2.65 ; 18.675,2.65 19.425,2.65 ; 21.215,-2.65 21.965,-2.65 ; 21.215,2.65 21.965,2.65 ; 23.755,-2.65 24.505,-2.65 ; 23.755,2.65 24.505,2.65 ; 26.295,-2.65 27.045,-2.65 ; 26.295,2.65 27.045,2.65 ; 28.835,-2.65 29.585,-2.65 ; 28.835,2.65 29.585,2.65 ; 31.375,-2.65 32.125,-2.65 ; 31.375,2.65 32.125,2.65 ; 33.915,-2.65 34.665,-2.65 ; 33.915,2.65 34.665,2.65 ; 36.455,-2.65 37.205,-2.65 ; 36.455,2.65 37.205,2.65 ; 38.995,-2.65 39.745,-2.65 ; 38.995,2.65 39.745,2.65 ; 41.535,-2.65 42.285,-2.65 ; 41.535,2.65 42.285,2.65 ; 44.075,-2.65 44.825,-2.65 ; 44.075,2.65 44.825,2.65 ; 46.615,-2.65 47.1,-2.65 47.1,2.65 46.615,2.65